# Altium footprint library PcbLib1.PcbLib: 170 footprints (part 10 of 11)
Each footprint in its own frame and in the unit in brackets; x right, y up, seen from the top. Pads: shape width x height; smd on the part's side, far side on the other; paste and mask are expansions set on the pad; w line width, h text height; cw(c..) or ccw(c..) is an arc to the next point about the centre after c.
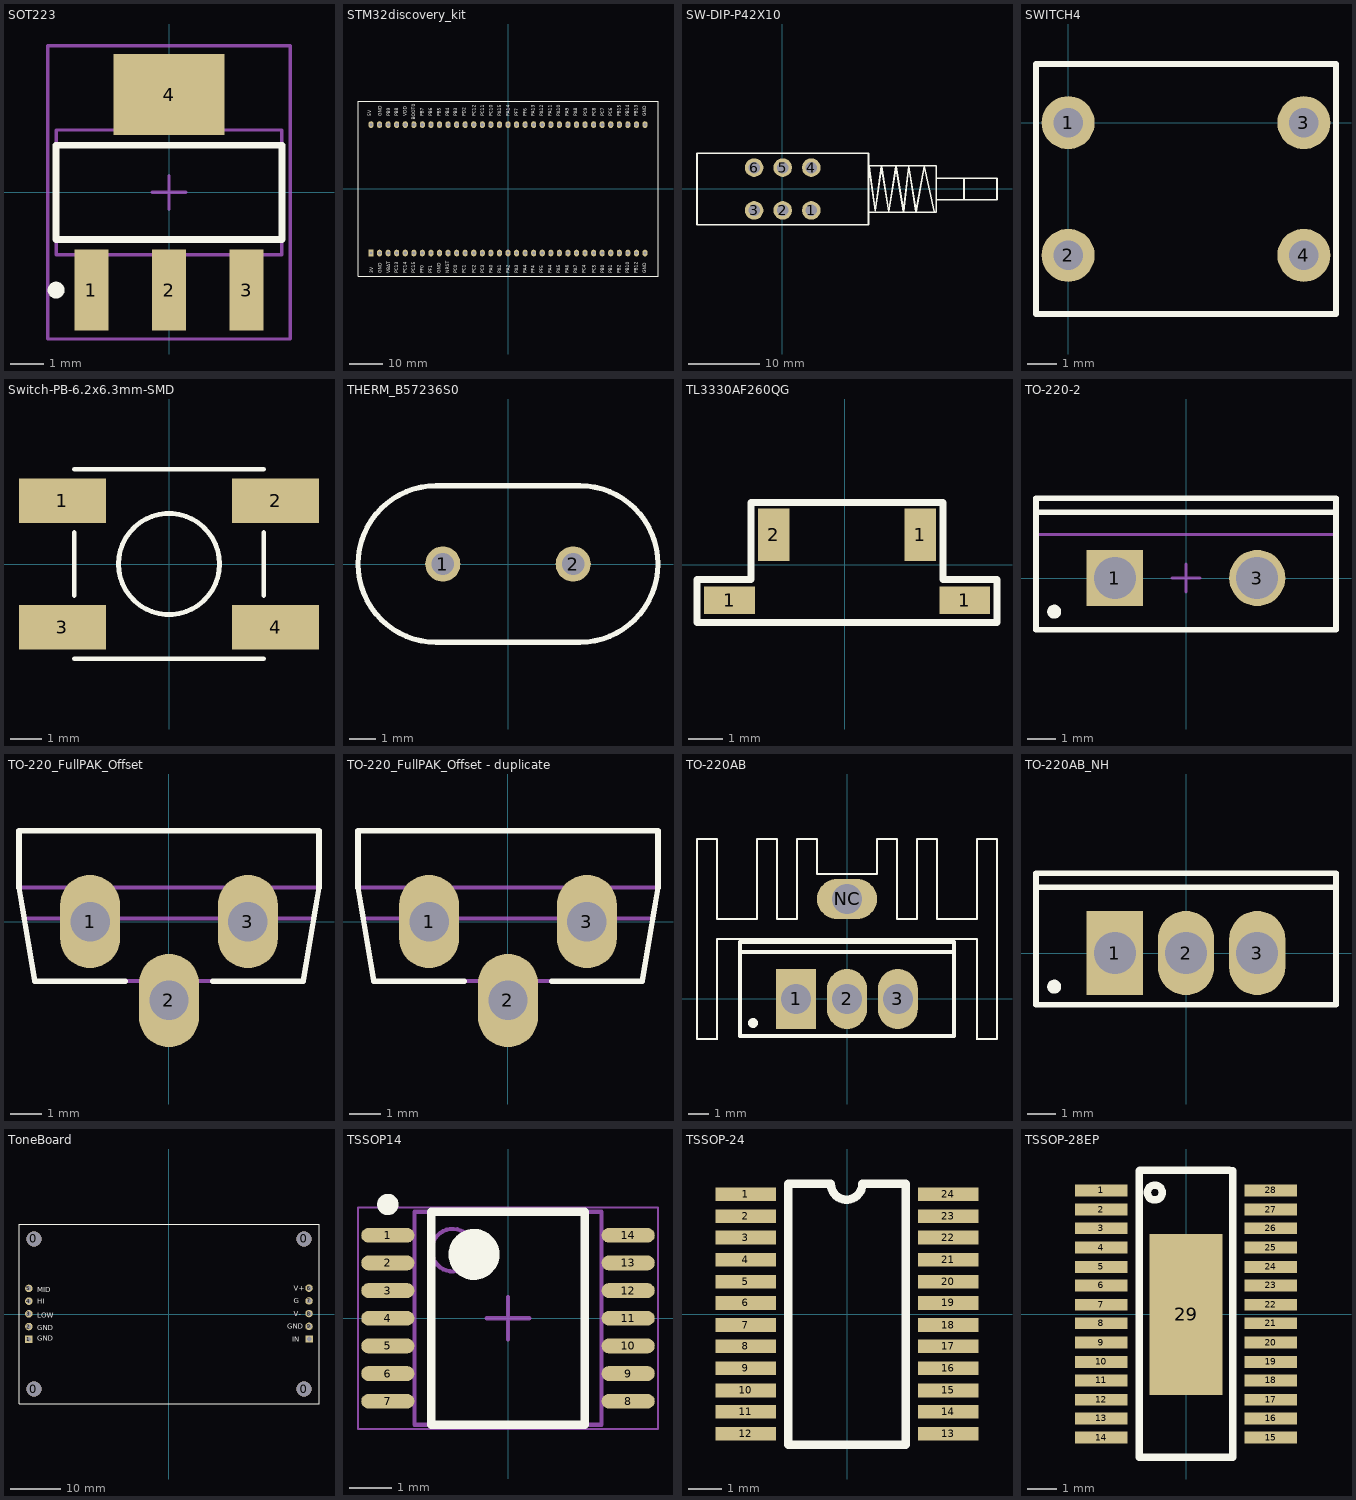
[diagram p9: the footprints below, top view; thin cyan lines are the x and y axes]

## SOT223 [mm]
height 4
pads (4):
  rect 1x2.4 smd: 1(-2.3,-2.9) 2(0,-2.9) 3(2.3,-2.9)
  rect 3.3x2.4 smd: 4(0,2.9)
Top Overlay:
  circle w0.25: c-3.35,-2.9 r0.125
  lines w0.2: -3.35,-1.4 3.35,-1.4 3.35,1.4 -3.35,1.4 -3.35,-1.4
Mechanical 13:
  lines w0.1: -3.35,-1.85 3.35,-1.85 3.35,1.85 -3.35,1.85 -3.35,-1.85
Mechanical 15:
  lines w0.1: -0.5,0 0.5,0 ; 0,-0.5 0,0.5 ; -3.6,-4.35 3.6,-4.35 3.6,4.35 -3.6,4.35 -3.6,-4.35
3D body: height 1.68, standoff 0, extent -3.25,-3.556 3.25,3.404

## STM32discovery_kit [mm]
pads (66):
  rect 1.5x2 hole 1 paste+0: 1(-40.64,-19.05)
  oval 1.5x2 hole 1 paste+0: 2(-38.1,-19.05) 3(-35.56,-19.05) 4(-33.02,-19.05) 5(-30.48,-19.05) 6(-27.94,-19.05) 7(-25.4,-19.05) 8(-22.86,-19.05) 9(-20.32,-19.05) 10(-17.78,-19.05) 11(-15.24,-19.05) 12(-12.7,-19.05) 13(-10.16,-19.05) 14(-7.62,-19.05) 15(-5.08,-19.05) 16(-2.54,-19.05) 17(0,-19.05) 18(2.54,-19.05) 19(5.08,-19.05) 20(7.62,-19.05) 21(10.16,-19.05) 22(12.7,-19.05) 23(15.24,-19.05) 24(17.78,-19.05) 25(20.32,-19.05) 26(22.86,-19.05) 27(25.4,-19.05) 28(27.94,-19.05) 29(30.48,-19.05) 30(33.02,-19.05) 31(35.56,-19.05) 32(38.1,-19.05) 33(40.64,-19.05) 34(40.64,19.05) 35(38.1,19.05) 36(35.56,19.05) 37(33.02,19.05) 38(30.48,19.05) 39(27.94,19.05) 40(25.4,19.05) 41(22.86,19.05) 42(20.32,19.05) 43(17.78,19.05) 44(15.24,19.05) 45(12.7,19.05) 46(10.16,19.05) 47(7.62,19.05) 48(5.08,19.05) 49(2.54,19.05) 50(0,19.05) 51(-2.54,19.05) 52(-5.08,19.05) 53(-7.62,19.05) 54(-10.16,19.05) 55(-12.7,19.05) 56(-15.24,19.05) 57(-17.78,19.05) 58(-20.32,19.05) 59(-22.86,19.05) 60(-25.4,19.05) 61(-27.94,19.05) 62(-30.48,19.05) 63(-33.02,19.05) 64(-35.56,19.05) 65(-38.1,19.05) 66(-40.64,19.05)
Top Overlay:
  lines w0.2: 44.5,-26.05 44.5,25.9 ; 44.5,-26 -44.5,-26 -44.5,25.95 44.5,25.95
  text "PA8" at 20.5,21.5 h1
  text "PA9" at 18,21.5 h1
  text "GND" at -37.5,21.5 h1
  text "5V" at -40.5,21.5 h1
  text "PB9" at -35,21.5 h1
  text "PB8" at -32.5,21.5 h1
  text "VDD" at -30,21.5 h1
  text "BOOT0" at -27.5,20.5 h1
  text "PB7" at -25,21.5 h1
  text "PB6" at -22.5,21.5 h1
  text "PB5" at -20,21.5 h1
  text "PB4" at -17.5,21.5 h1
  text "PB3" at -15,21.5 h1
  text "PD2" at -12.5,21.5 h1
  text "PC12" at -9.5,21.5 h1
  text "PC11" at -7,21.5 h1
  text "PC10" at -4.5,21.5 h1
  text "PF7" at 3,21.5 h1
  text "PF6" at 5.5,21.5 h1
  text "PA13" at 8,21.5 h1
  text "PA12" at 10.5,21.5 h1
  text "PB15" at 33.5,21.5 h1
  text "PB14" at 36,21.5 h1
  text "PB13" at 38.5,21.5 h1
  text "GND" at 41,-25 h1
  text "PB12" at 38.5,-25 h1
  text "PB10" at 36,-25 h1
  text "PB2" at 33.5,-25 h1
  text "PB1" at 31,-25 h1
  text "PB0" at 28.5,-25 h1
  text "PC5" at 26,-25 h1
  text "PC4" at 23,-25 h1
  text "3V" at -40,-25 h1
  text "GND" at -37.5,-25 h1
  text "VBAT" at -35,-25 h1
  text "PC13" at -32.5,-25 h1
  text "PC14" at -30,-25 h1
  text "PC15" at -27.5,-25 h1
  text "PF0" at -25,-25 h1
  text "PF1" at -22.5,-25 h1
  text "GND" at -20,-25 h1
  text "NRST" at -17.5,-25 h1
  text "PC0" at -15,-25 h1
  text "PC1" at -12.5,-25 h1
  text "PC2" at -9.5,-25 h1
  text "PC3" at -7,-25 h1
  text "PA0" at -4.5,-25 h1
  text "PA1" at -2,-25 h1
  text "PA2" at 0.5,-25 h1
  text "PA3" at 3,-25 h1
  text "PA4" at 5.5,-25 h1
  text "PF4" at 8,-25 h1
  text "PF5" at 10.5,-25 h1
  text "PA4" at 13,-25 h1
  text "PA5" at 15.5,-25 h1
  text "PA6" at 18,-25 h1
  text "PA7" at 20.5,-25 h1
  text "GND" at 41,21.5 h1
  text "PC6" at 31,21.5 h1
  text "PC7" at 28.5,21.5 h1
  text "PC8" at 26,21.5 h1
  text "PC9" at 23.5,21.5 h1
  text "PA10" at 15.5,21.5 h1
  text "PA11" at 13,21.5 h1
  text "PA14" at 0.5,21.5 h1
  text "PA15" at -2,21.5 h1

## SW-DIP-P42X10 [mm]
pads (6):
  round 2.6 hole 1.6: 1(4.064,-3.048) 2(0.064,-3.048) 3(-3.936,-3.048) 4(4.064,2.952) 5(0.064,2.952) 6(-3.936,2.952)
Top Overlay:
  lines w0.254: 12.129,3.127 13.018,-3.096 13.907,3.127 14.923,-3.223 15.939,3.127 16.955,-3.223 17.717,3.127 18.733,-3.223 19.876,3.127 21.273,-3.223 ; 25.464,-1.445 25.464,1.349 ; -11.936,-5.048 12.064,-5.048 12.064,4.952 -11.936,4.952 -11.936,-5.048 ; 12.064,-3.298 21.564,-3.298 21.564,3.202 12.064,3.202 12.064,-3.298 ; 21.564,-1.548 30.064,-1.548 30.064,1.452 21.564,1.452 21.564,-1.548
3D body: height 13.1, standoff -4.9, extent -9.92,-5.18 32.08,4.82

## SWITCH4 [mm]
height 2.54
pads (4):
  round 1.8 hole 1: 1(0,0) 2(0,-4.5) 3(8,0) 4(8,-4.5)
Top Overlay:
  lines w0.2: -1.092,-6.5 9.093,-6.5 9.093,2 -1.092,2 -1.092,-6.5

## Switch-PB-6.2x6.3mm-SMD [mm] "6.2×6.5mm TACT Switch, without ground connector"
height 2.5
pads (4):
  rect 2.75x1.4 smd: 1(-3.375,2) 2(3.375,2) 3(-3.375,-2) 4(3.375,-2)
Top Overlay:
  circle w0.152: c0,0 r1.601
  lines w0.152: -3,-3 3,-3 ; -3,-1 -3,1 ; -3,3 3,3 ; 3,-1 3,1
3D body: height 3.1, standoff 0, extent -4,-3 4,3.3

## THERM_B57236S0 [mm] "EPCOS"
height 16
pads (2):
  round 1.35 hole 0.85: 1(-2.5,0) 2(2.5,0)
Top Overlay:
  lines w0.2: -2.75,-3 cw(c-2.75,0) -2.75,3 2.75,3 cw(c2.75,0) 2.75,-3 -2.75,-3
Mechanical 5:
  lines w0.1: -2.75,-3 cw(c-2.75,0) -2.75,3 2.75,3 cw(c2.75,0) 2.75,-3 -2.75,-3
3D body: height 15.99, standoff 4.51, extent -5.755,-3 5.7,3
3D body: height 5.5, standoff -2.5, extent 2.202,-0.299 2.8,0.3
3D body: height 5.5, standoff -2.5, extent -2.797,-0.299 -2.2,0.3

## TL3330AF260QG [mm]
pads (4):
  rect 1.45x0.8 smd: 1(-3.302,-1.016) 1(3.444,-1.016)
  rect 0.9x1.5 smd: 1(2.167,0.864) 2(-2.035,0.864)
Top Overlay:
  lines w0.2: -2.685,-0.417 -4.234,-0.417 -4.234,-1.646 4.366,-1.646 ; -2.685,-0.366 -2.685,1.79 2.817,1.79 2.817,-0.366 ; 2.817,-0.417 4.366,-0.417 4.366,-1.643
3D body: height 3.41, standoff -0.09, extent -3.83,-2.18 3.97,1.329

## TO-220-2 [mm] "TO, Thru-Hole, Vertical, Heatsink Mounted; 3 In-Line Leads; Pitch 2.54 mm"
height 19.3
pads (2):
  rect 2x2 hole 1.5: 1(-2.54,0)
  round 2 hole 1.5: 3(2.54,0)
Top Overlay:
  circle w0.25: c-4.7,-1.2 r0.125
  lines w0.2: -5.35,2.35 5.35,2.35 ; -5.35,-1.85 5.35,-1.85 5.35,2.85 -5.35,2.85 -5.35,-1.85
Mechanical 13:
  lines w0.1: -5.35,1.55 5.35,1.55 ; -5.35,-1.85 -5.35,2.85 5.35,2.85 5.35,-1.85 -5.35,-1.85
Mechanical 15:
  lines w0.1: -0.5,0 0.5,0 ; 0,-0.5 0,0.5
3D body: height 19.3, standoff 12.9, extent -5.349,1.551 5.349,2.849
3D body: height 12.9, standoff 4, extent -5.4,-1.9 5.4,2.9

## TO-220_FullPAK_Offset [mm] "Infineon  PG-TO220-3-31"
height 19.4
pads (3):
  oval 1.93x3 hole 1.27: 1(-2.54,0) 2(0,-2.54) 3(2.54,0)
Top Overlay:
  lines w0.178: -4.655,0.095 -4.825,1.095 ; -4.325,-1.915 -1.4,-1.915 ; -4.325,-1.915 -4.825,1.085 -4.825,1.095 ; 1.4,-1.915 4.325,-1.915 4.825,1.085 4.825,1.095 ; 4.655,0.095 4.825,1.095 ; -4.825,1.095 -4.825,2.915 4.825,2.915 4.825,1.095
Mechanical 5:
  lines w0.127: -0.89,-1.915 -0.89,-2.058 -0.89,-2.853 0.89,-2.853 0.89,-1.915 ; -4.825,1.095 -4.825,2.915 4.825,2.915 4.825,1.095 ; -4.825,1.095 4.825,1.095 ; -4.825,1.095 -4.655,0.095 4.655,0.095 4.825,1.095 ; -4.825,1.095 -4.825,1.085 -4.325,-1.915 4.325,-1.915 4.825,1.085 4.825,1.095
3D body: height 22.91, standoff -3.95, extent -4.825,-2.845 4.825,2.915
3D body: height 24, standoff 4, extent -11.75,-4 11.75,11

## TO-220_FullPAK_Offset - duplicate [mm] "Infineon  PG-TO220-3-31"
height 19.4
pads (3):
  oval 1.93x3 hole 1.27: 1(-2.54,0) 2(0,-2.54) 3(2.54,0)
Top Overlay:
  lines w0.178: -4.655,0.095 -4.825,1.095 ; -4.325,-1.915 -1.4,-1.915 ; -4.325,-1.915 -4.825,1.085 -4.825,1.095 ; 1.4,-1.915 4.325,-1.915 4.825,1.085 4.825,1.095 ; 4.655,0.095 4.825,1.095 ; -4.825,1.095 -4.825,2.915 4.825,2.915 4.825,1.095
Mechanical 5:
  lines w0.127: -0.89,-1.915 -0.89,-2.058 -0.89,-2.853 0.89,-2.853 0.89,-1.915 ; -4.825,1.095 -4.825,1.085 -4.325,-1.915 4.325,-1.915 4.825,1.085 4.825,1.095 ; -4.825,1.095 -4.655,0.095 4.655,0.095 4.825,1.095 ; -4.825,1.095 4.825,1.095 ; -4.825,1.095 -4.825,2.915 4.825,2.915 4.825,1.095
3D body: height 22.91, standoff -3.95, extent -4.825,-2.845 4.825,2.915
3D body: height 24, standoff 4, extent -11.75,-4 11.75,11

## TO-220AB [mm] "TO, Thru-Hole, Vertical, Heatsink Mounted; 3 In-Line Leads; Pitch 2.54 mm"
height 19.3
pads (4):
  rect 2x3 hole 1.5 paste+0: 1(-2.54,0)
  oval 2x3 hole 1.5 paste+0: 2(0,0) 3(2.54,0)
  oval 3x2 hole 1.5 paste+0: NC(0,5)
Top Overlay:
  circle w0.25: c-4.7,-1.2 r0.125
  lines w0.1: -7.5,4 -7.5,-2 ; 7.5,4 7.5,-2 ; -7.5,-2 -6.5,-2 ; -7.5,-2 -7.5,8 -6.5,8 -6.5,4 -4.5,4 -4.5,8 -3.5,8 -3.5,4 -2.5,4 -2.5,8 -1.5,8 -1.5,6.25 1.5,6.25 1.5,8 2.5,8 2.5,4 3.5,4 3.5,8 4.5,8 4.5,4 6.5,4 6.5,8 7.5,8 7.5,-2 ; -6.5,-2 -6.5,3 6.5,3 6.5,-2 ; -6.5,-2 -6.5,-2 ; 6.5,-2 7.5,-2 ; 6.5,-2 6.5,-2
  lines w0.2: -5.35,2.35 5.35,2.35 ; -5.35,-1.85 5.35,-1.85 5.35,2.85 -5.35,2.85 -5.35,-1.85
Mechanical 13:
  lines w0.1: -5.35,-1.85 -5.35,2.85 5.35,2.85 5.35,-1.85 -5.35,-1.85
Mechanical 15:
  lines w0.1: -0.5,0 0.5,0 ; 0,-0.5 0,0.5
3D body: height 20.54, standoff -1.81, extent -5.08,-1.572 5.08,3

## TO-220AB_NH [mm] "TO, Thru-Hole, Vertical, Heatsink Mounted; 3 In-Line Leads; Pitch 2.54 mm"
height 19.3
pads (3):
  rect 2x3 hole 1.5 paste+0: 1(-2.54,0)
  oval 2x3 hole 1.5 paste+0: 2(0,0) 3(2.54,0)
Top Overlay:
  circle w0.25: c-4.7,-1.2 r0.125
  lines w0.2: -5.35,2.35 5.35,2.35 ; -5.35,-1.85 5.35,-1.85 5.35,2.85 -5.35,2.85 -5.35,-1.85
Mechanical 13:
  lines w0.1: -5.35,-1.85 -5.35,2.85 5.35,2.85 5.35,-1.85 -5.35,-1.85
Mechanical 15:
  lines w0.1: -0.5,0 0.5,0 ; 0,-0.5 0,0.5
3D body: height 20.54, standoff -1.81, extent -5.08,-1.572 5.08,3

## ToneBoard [mm]
pads (14):
  round 3 hole 3 mask+0.001: 0(-26.978,-15) 0(-26.978,15) 0(27.022,-15) 0(27.022,15)
  rect 1.5x1.5 hole 0.9: 1(-28.022,-5.046) 10(28.022,-5)
  round 1.5 hole 0.9: 2(-28.022,-2.506) 3(-28.022,0.034) 4(-28.022,2.574) 5(-28.022,5.114) 6(28.022,5.16) 7(28.022,2.62) 8(28.022,0.08) 9(28.022,-2.46)
Top Overlay:
  lines w0.2: -29.978,-18 30.022,-18 30.022,18 -29.978,18 -29.978,-18
  text "IN" at 24.689,-5.505 h1
  text "GND" at 23.673,-2.965 h1
  text "V-" at 24.943,-0.425 h1
  text "G" at 24.943,2.115 h1
  text "V+" at 24.943,4.655 h1
  text "MID" at -26.358,4.324 h1
  text "HI" at -26.358,2.038 h1
  text "LOW" at -26.358,-0.756 h1
  text "GND" at -26.358,-3.296 h1
  text "GND" at -26.358,-5.328 h1
3D body: height 16.5, standoff -2.41, extent -29.87,-18.059 30.13,17.941

## TSSOP14 [mm] "TSSOP, 14-Leads, Body 5.00x4.40mm, Pitch 0.65mm, IPC High Density"
height 1
pads (14):
  oval 1.25x0.35 smd: 1(-2.825,1.95) 2(-2.825,1.3) 3(-2.825,0.65) 4(-2.825,0) 5(-2.825,-0.65) 6(-2.825,-1.3) 7(-2.825,-1.95) 8(2.825,-1.95) 9(2.825,-1.3) 10(2.825,-0.65) 11(2.825,0) 12(2.825,0.65) 13(2.825,1.3) 14(2.825,1.95)
Top Overlay:
  circle w0.25: c-2.825,2.675 r0.125
  circle w0.6: c-0.8,1.5 r0.3
  lines w0.2: -1.8,-2.5 -1.8,2.5 1.8,2.5 1.8,-2.5 -1.8,-2.5
Mechanical 13:
  circle w0.1: c-1.3,1.6 r0.5
  lines w0.1: -2.2,-2.5 -2.2,2.5 2.2,2.5 2.2,-2.5 -2.2,-2.5
Mechanical 15:
  lines w0.05: -3.525,-2.6 -3.525,2.6 3.525,2.6 3.525,-2.6 -3.525,-2.6
  lines w0.1: -0.5,0 0.5,0 ; 0,-0.5 0,0.5
3D body: height 1.25, standoff 0, extent -3.228,-2.55 3.228,2.55

## TSSOP-24 [mil]
pads (24):
  rect 71x16 smd: 1(-119,141) 2(-119,115) 3(-119,90) 4(-119,64) 5(-119,38) 6(-119,13) 7(-119,-13) 8(-119,-38) 9(-119,-64) 10(-119,-90) 11(-119,-115) 12(-119,-141) 13(119,-141) 14(119,-115) 15(119,-90) 16(119,-64) 17(119,-38) 18(119,-13) 19(119,13) 20(119,38) 21(119,64) 22(119,90) 23(119,115) 24(119,141)
Top Overlay:
  lines w10: -69,-154 -69,121.3 -69,153.1 ; -69,153 -19,153 ccw(c-0.5,153) 18,153 ; -68.9,-154 69,-154 ; 19,153 69,153 69,-154.1
3D body: height 41.82, standoff -5.42, extent -129.05,-155.51 129.05,155.51

## TSSOP-28EP [mil]
pads (29):
  rect 71x16 smd: 1(-114,166.5) 2(-114,140.5) 3(-114,115.5) 4(-114,89.5) 5(-114,63.5) 6(-114,38.5) 7(-114,12.5) 8(-114,-12.5) 9(-114,-38.5) 10(-114,-64.5) 11(-114,-89.5) 12(-114,-115.5) 13(-114,-140.5) 14(-114,-166.5) 15(114,-166.5) 16(114,-140.5) 17(114,-115.5) 18(114,-89.5) 19(114,-64.5) 20(114,-38.5) 21(114,-12.5) 22(114,12.5) 23(114,38.5) 24(114,63.5) 25(114,89.5) 26(114,115.5) 27(114,140.5) 28(114,166.5)
  rect 98x217 smd: 29(0,-0.5)
Top Overlay:
  circle w10: c-42,163.5 r10
  lines w10: -63.1,192.9 -63.1,-192.9 62.8,-192.9 62.8,192.9 ; -62,193.5 58,193.5
3D body: height 45.56, standoff 0.48, extent -125.98,-190.94 125.98,190.95